# Altium footprint library Components.PcbLib: 127 footprints (part 8 of 8)
Each footprint in its own frame and in the unit in brackets; x right, y up, seen from the top. Pads: shape width x height; smd on the part's side, far side on the other; paste and mask are expansions set on the pad; w line width, h text height; cw(c..) or ccw(c..) is an arc to the next point about the centre after c.
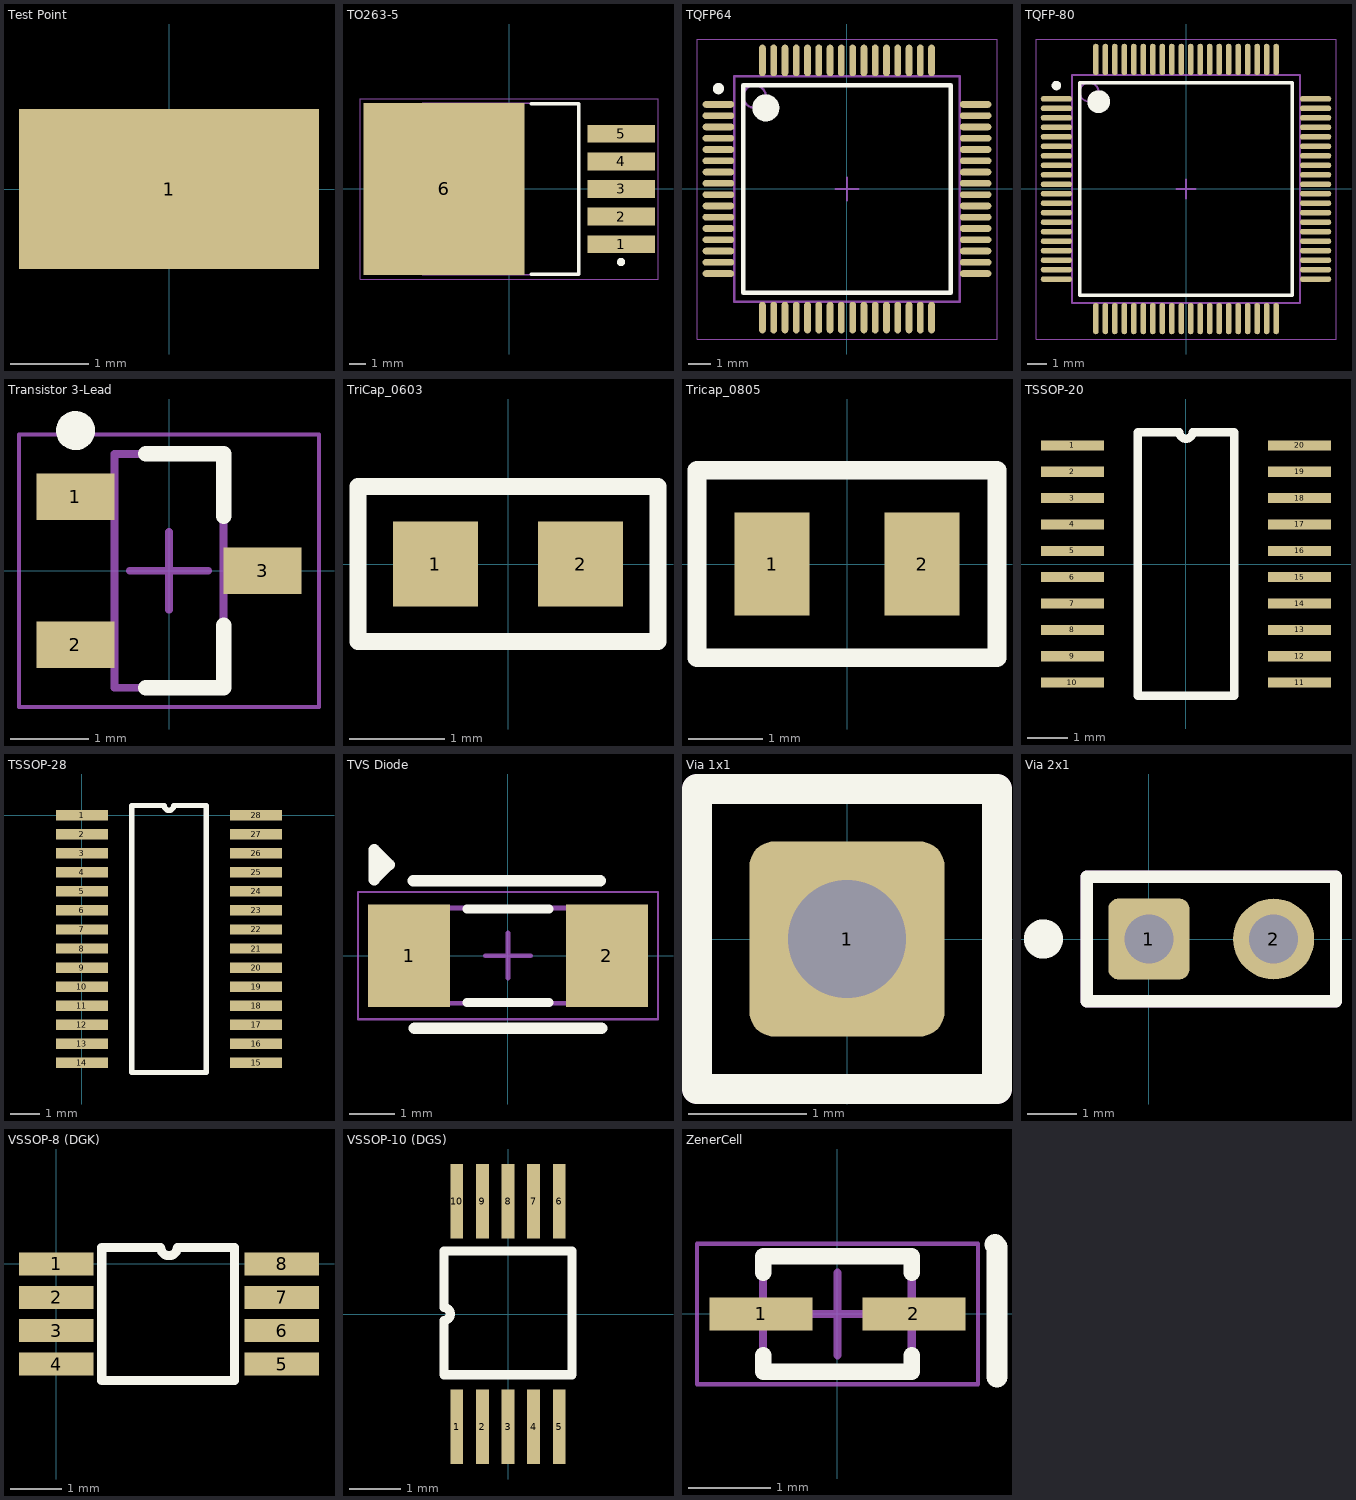
[diagram p7: the footprints below, top view; thin cyan lines are the x and y axes]

## Test Point [mil]
pads (1):
  rect 150x80 smd: 1(0,0)
3D body: height 90, standoff 1, extent -75,-30 75,30

## TO263-5 [mm] "D2-PAK, 6-Pads, Body 7.93x8.63mm (max), IPC Medium Density"
height 4.85
pads (6):
  rect 4.15x1.1 smd: 1(6.9,-3.4) 2(6.9,-1.7) 3(6.9,0) 4(6.9,1.7) 5(6.9,3.4)
  rect 9.9x10.6 smd: 6(-4,0)
Top Overlay:
  circle w0.25: c6.9,-4.5 r0.125
  lines w0.2: 1.35,-5.25 4.3,-5.25 4.3,5.25 1.35,5.25
Mechanical 13:
  lines w0.1: -5.35,-5.275 4.3,-5.275 4.3,5.275 -5.35,5.275 -5.35,-5.275
Mechanical 15:
  lines w0.05: -9.175,-5.55 9.175,-5.55 9.175,5.55 -9.175,5.55 -9.175,-5.55
  lines w0.1: -0.5,0 0.5,0 ; 0,-0.5 0,0.5
3D body "TO263-5-1.stp": height 4.22, standoff 0, extent -7.491,-4.889 7.111,4.932

## TQFP64 [mm] "TSQFP, 64-Leads, Body 10.00x10.00mm, Pitch 0.50mm, IPC Medium Density"
height 1.6
pads (64):
  oval 1.4x0.3 smd: 1(-5.7,3.75) 2(-5.7,3.25) 3(-5.7,2.75) 4(-5.7,2.25) 5(-5.7,1.75) 6(-5.7,1.25) 7(-5.7,0.75) 8(-5.7,0.25) 9(-5.7,-0.25) 10(-5.7,-0.75) 11(-5.7,-1.25) 12(-5.7,-1.75) 13(-5.7,-2.25) 14(-5.7,-2.75) 15(-5.7,-3.25) 16(-5.7,-3.75) 33(5.7,-3.75) 34(5.7,-3.25) 35(5.7,-2.75) 36(5.7,-2.25) 37(5.7,-1.75) 38(5.7,-1.25) 39(5.7,-0.75) 40(5.7,-0.25) 41(5.7,0.25) 42(5.7,0.75) 43(5.7,1.25) 44(5.7,1.75) 45(5.7,2.25) 46(5.7,2.75) 47(5.7,3.25) 48(5.7,3.75)
  oval 0.3x1.4 smd: 17(-3.75,-5.7) 18(-3.25,-5.7) 19(-2.75,-5.7) 20(-2.25,-5.7) 21(-1.75,-5.7) 22(-1.25,-5.7) 23(-0.75,-5.7) 24(-0.25,-5.7) 25(0.25,-5.7) 26(0.75,-5.7) 27(1.25,-5.7) 28(1.75,-5.7) 29(2.25,-5.7) 30(2.75,-5.7) 31(3.25,-5.7) 32(3.75,-5.7) 49(3.75,5.7) 50(3.25,5.7) 51(2.75,5.7) 52(2.25,5.7) 53(1.75,5.7) 54(1.25,5.7) 55(0.75,5.7) 56(0.25,5.7) 57(-0.25,5.7) 58(-0.75,5.7) 59(-1.25,5.7) 60(-1.75,5.7) 61(-2.25,5.7) 62(-2.75,5.7) 63(-3.25,5.7) 64(-3.75,5.7)
Top Overlay:
  circle w0.25: c-5.7,4.45 r0.125
  circle w0.6: c-3.6,3.6 r0.3
  lines w0.2: -4.6,-4.6 -4.6,4.6 4.6,4.6 4.6,-4.6 -4.6,-4.6
Mechanical 13:
  circle w0.1: c-4.1,4.1 r0.5
  lines w0.1: -5,-5 -5,5 5,5 5,-5 -5,-5
Mechanical 15:
  lines w0.05: -6.65,-6.65 -6.65,6.65 6.65,6.65 6.65,-6.65 -6.65,-6.65
  lines w0.1: -0.5,0 0.5,0 ; 0,-0.5 0,0.5
3D body: height 1.6, standoff 0.05, extent -5,-5 5,5

## TQFP-80 [mm]
pads (80):
  oval 1.65x0.3 smd: 1(-6.841,4.74) 2(-6.841,4.24) 3(-6.841,3.74) 4(-6.841,3.24) 5(-6.841,2.74) 6(-6.841,2.24) 7(-6.841,1.74) 8(-6.841,1.24) 9(-6.841,0.74) 10(-6.841,0.24) 11(-6.841,-0.26) 12(-6.841,-0.76) 13(-6.841,-1.26) 14(-6.841,-1.76) 15(-6.841,-2.26) 16(-6.841,-2.76) 17(-6.841,-3.26) 18(-6.841,-3.76) 19(-6.841,-4.26) 20(-6.841,-4.76) 41(6.809,-4.76) 42(6.809,-4.26) 43(6.809,-3.76) 44(6.809,-3.26) 45(6.809,-2.76) 46(6.809,-2.26) 47(6.809,-1.76) 48(6.809,-1.26) 49(6.809,-0.76) 50(6.809,-0.26) 51(6.809,0.24) 52(6.809,0.74) 53(6.809,1.24) 54(6.809,1.74) 55(6.809,2.24) 56(6.809,2.74) 57(6.809,3.24) 58(6.809,3.74) 59(6.809,4.24) 60(6.809,4.74)
  oval 0.3x1.65 smd: 21(-4.766,-6.835) 22(-4.266,-6.835) 23(-3.766,-6.835) 24(-3.266,-6.835) 25(-2.766,-6.835) 26(-2.266,-6.835) 27(-1.766,-6.835) 28(-1.266,-6.835) 29(-0.766,-6.835) 30(-0.266,-6.835) 31(0.234,-6.835) 32(0.734,-6.835) 33(1.234,-6.835) 34(1.734,-6.835) 35(2.234,-6.835) 36(2.734,-6.835) 37(3.234,-6.835) 38(3.734,-6.835) 39(4.234,-6.835) 40(4.734,-6.835) 61(4.734,6.815) 62(4.234,6.815) 63(3.734,6.815) 64(3.234,6.815) 65(2.734,6.815) 66(2.234,6.815) 67(1.734,6.815) 68(1.234,6.815) 69(0.734,6.815) 70(0.234,6.815) 71(-0.266,6.815) 72(-0.766,6.815) 73(-1.266,6.815) 74(-1.766,6.815) 75(-2.266,6.815) 76(-2.766,6.815) 77(-3.266,6.815) 78(-3.766,6.815) 79(-4.266,6.815) 80(-4.766,6.815)
Top Overlay:
  circle w0.6: c-4.616,4.59 r0.3
  circle w0.25: c-6.841,5.44 r0.125
  lines w0.2: -5.616,-5.61 5.584,-5.61 5.584,5.59 -5.616,5.59 -5.616,-5.61
Mechanical 13:
  circle w0.1: c-5.116,5.09 r0.5
  lines w0.1: -6.016,-6.01 5.984,-6.01 5.984,5.99 -6.016,5.99 -6.016,-6.01
Mechanical 15:
  lines w0.05: -7.916,-7.91 7.884,-7.91 7.884,7.89 -7.916,7.89 -7.916,-7.91
  lines w0.1: -0.516,-0.01 0.484,-0.01 ; -0.016,-0.51 -0.016,0.49
3D body: height 2, standoff 0, extent -6.071,-6.02 6.172,6.071
3D body "LQFP80.step": height 1.4, standoff 0, extent -7.01,-7.015 6.99,6.985

## Transistor 3-Lead [mm] "SOT23, 3-Leads, Body 2.90x2.45mm, Pitch 0.95mm, IPC Medium Density"
height 1.1
pads (3):
  rect 1x0.6 smd: 1(-1.2,0.95) 2(-1.2,-0.95) 3(1.2,0)
Top Overlay:
  circle w0.25: c-1.2,1.8 r0.125
  lines w0.2: -0.3,-1.5 0.7,-1.5 0.7,-0.7 ; -0.3,1.5 0.7,1.5 0.7,0.7
Mechanical 13:
  lines w0.1: -0.7,-1.5 -0.7,1.5 0.7,1.5 0.7,-1.5 -0.7,-1.5
Mechanical 15:
  lines w0.05: -1.925,-1.75 -1.925,1.75 1.925,1.75 1.925,-1.75 -1.925,-1.75
  lines w0.1: -0.5,0 0.5,0 ; 0,-0.5 0,0.5
3D body "SOT23_3.stp": height 1, standoff 0, extent -1.35,-1.5 1.2,1.5

## TriCap_0603 [mil]
pads (2):
  rect 35x35 smd: 1(-30,0) 2(30,0)
Top Overlay:
  lines w7: -62,-32 -62,2 -62,32 62,32 62,-32 -62,-32
3D body "CAPC-0603-T0.9-BN.stp": height 35.43, standoff 0, extent -33.47,-17.71 33.47,17.72
3D body "CAPC-0603-T0.9-BN.stp": height 70.87, standoff 35.43, extent -33.46,-17.71 33.47,17.72
3D body "CAPC-0603-T0.9-BN.stp": height 106.3, standoff 70.87, extent -33.46,-17.71 33.48,17.72

## Tricap_0805 [mil]
pads (2):
  rect 40x55 smd: 1(-40,0) 2(40,0)
Top Overlay:
  lines w10: -80,-50 80,-50 80,50 -80,50 -80,-7.5 -80,-50
3D body "CAPC-0805-T1.35-BN.stp": height 159.45, standoff 106.3, extent -41.33,-26.58 41.34,26.58
3D body "CAPC-0805-T1.35-BN.stp": height 106.3, standoff 53.15, extent -41.33,-26.57 41.34,26.58
3D body "CAPC-0805-T1.35-BN.stp": height 53.15, standoff 0, extent -41.33,-26.57 41.34,26.58

## TSSOP-20 [mm] "Specifically: PW (R-PDSO-G20)"
pads (20):
  rect 1.55x0.25 smd: 1(-2.8,2.925) 2(-2.8,2.275) 3(-2.8,1.625) 4(-2.8,0.975) 5(-2.8,0.325) 6(-2.8,-0.325) 7(-2.8,-0.975) 8(-2.8,-1.625) 9(-2.8,-2.275) 10(-2.8,-2.925) 11(2.8,-2.925) 12(2.8,-2.275) 13(2.8,-1.625) 14(2.8,-0.975) 15(2.8,-0.325) 16(2.8,0.325) 17(2.8,0.975) 18(2.8,1.625) 19(2.8,2.275) 20(2.8,2.925)
Top Overlay:
  lines w0.2: -1.19,-3.25 -1.19,3.25 -0.162,3.25 ccw(c0,3.25) 0.162,3.25 1.19,3.25 1.19,-3.25 -1.19,-3.25

## TSSOP-28 [mm]
pads (28):
  rect 1.78x0.356 smd mask+0.051: 1(0,0) 2(0,-0.65) 3(0,-1.3) 4(0,-1.95) 5(0,-2.6) 6(0,-3.25) 7(0,-3.9) 8(0,-4.55) 9(0,-5.2) 10(0,-5.85) 11(0,-6.5) 12(0,-7.15) 13(0,-7.8) 14(0,-8.45) 15(5.94,-8.45) 16(5.94,-7.8) 17(5.94,-7.15) 18(5.94,-6.5) 19(5.94,-5.85) 20(5.94,-5.2) 21(5.94,-4.55) 22(5.94,-3.9) 23(5.94,-3.25) 24(5.94,-2.6) 25(5.94,-1.95) 26(5.94,-1.3) 27(5.94,-0.65) 28(5.94,0)
Top Overlay:
  lines w0.178: 1.703,-8.775 1.703,0.325 2.808,0.325 ccw(c2.97,0.325) 3.132,0.325 4.237,0.325 4.237,-8.775 1.703,-8.775

## TVS Diode [mm] "Chip Diode, 2-Leads, Body 5.24x2.10mm, IPC Medium Density"
height 2.62
pads (2):
  rect 1.8x2.25 smd: 1(-2.175,0) 2(2.175,0)
Top Overlay:
  lines w0.2: -0.9,-1.025 0.9,-1.025 ; -0.9,1.025 0.9,1.025
  lines w0.254: -2.845,2.057 -2.794,2.007 -2.616,2.007 ; -2.083,1.651 2.032,1.651 ; -2.057,-1.6 2.057,-1.6 ; -2.616,2.007 -2.946,2.337 -2.946,1.676 -2.616,2.007
Mechanical 13:
  lines w0.1: -2.62,-1.05 -2.62,1.05 2.62,1.05 2.62,-1.05 -2.62,-1.05
Mechanical 15:
  lines w0.05: -3.3,-1.4 -3.3,1.4 3.3,1.4 3.3,-1.4 -3.3,-1.4
  lines w0.1: -0.5,0 0.5,0 ; 0,-0.5 0,0.5
3D body "SMASeries.step": height 2.34, standoff 0, extent -2.667,-1.498 2.617,1.296

## Via 1x1 [mil]
pads (1):
  rrect25% 65x65 hole 39.37: 1(0,0)
Top Overlay:
  lines w10: -50,50 50,50 ; -50,50 -50,-50 50,-50 50,50 ; -50,50 50,50
Mechanical 3:
  lines w10: -50,50 50,50 ; -50,50 -50,-50 50,-50 50,50 ; -50,50 50,50

## Via 2x1 [mil]
pads (2):
  rrect25% 65x65 hole 39.37: 1(0,0)
  round 65 hole 39.37: 2(100,0)
Top Overlay:
  circle w19.68: c-84.65,0 r5.91
  lines w10: 50,50 -50,50 ; -50,50 -50,-50 150,-50 150,50 -50,50
Mechanical 3:
  lines w10: 50,50 -50,50 ; -50,50 -50,-50 150,-50 150,50 -50,50

## VSSOP-8 (DGK) [mm]
pads (8):
  rect 1.45x0.45 smd mask+0.025: 1(0,0) 2(0,-0.65) 3(0,-1.3) 4(0,-1.95) 5(4.4,-1.95) 6(4.4,-1.3) 7(4.4,-0.65) 8(4.4,0)
Top Overlay:
  lines w0.178: 3.429,-2.275 0.889,-2.275 0.889,0.325 2.037,0.325 ccw(c2.2,0.325) 2.362,0.325 3.429,0.325 ; 3.48,-2.275 3.48,0.325

## VSSOP-10 (DGS) [mm]
height 1.1
pads (10):
  rect 0.25x1.45 smd mask+0.05: 1(-1,-2.2) 2(-0.5,-2.2) 3(0,-2.2) 4(0.5,-2.2) 5(1,-2.2) 6(1,2.2) 7(0.5,2.2) 8(0,2.2) 9(-0.5,2.2) 10(-1,2.2)
Top Overlay:
  lines w0.178: -1.25,-1.184 -1.25,-0.125 ccw(c-1.25,0) -1.25,0.125 -1.25,1.229 1.25,1.229 1.25,-1.184 -1.25,-1.184

## ZenerCell [mm] "SODFL, 2-Leads, Body 1.25x2.50mm, IPC Medium Density"
height 0.9
pads (2):
  rect 1.25x0.4 smd: 1(-0.925,0) 2(0.925,0)
Top Overlay:
  lines w0.2: -0.9,-0.5 -0.9,-0.7 0.9,-0.7 0.9,-0.5 ; -0.9,0.5 -0.9,0.7 0.9,0.7 0.9,0.5
  lines w0.254: 1.905,0.838 1.93,0.813 1.93,-0.762
Mechanical 13:
  lines w0.1: -0.9,-0.675 -0.9,0.675 0.9,0.675 0.9,-0.675 -0.9,-0.675
Mechanical 15:
  lines w0.05: -1.7,-0.85 -1.7,0.85 1.7,0.85 1.7,-0.85 -1.7,-0.85
  lines w0.1: -0.5,0 0.5,0 ; 0,-0.5 0,0.5
3D body "UMD2.stp": height 0.69, standoff -0.01, extent -1.25,-0.625 1.25,0.625